# Altium schematic symbol library GyokuRe.SchLib: 1131 symbols (part 5 of 8) (continued)
## MAX1037
designator U?
4 Channel 8 Bit ADC, I2C interface, 2.7V to 3.6V Supply; Vendor: Digikey; Published: 5-Jan-2004; DatasheetDocument: Rev1, Oct-2002; Publisher: Altium Limited; ComponentLink1Description: Digikey Part Link; ComponentLink2Description: Open Datasheet; ComponentLink2URL: H:\LIBRARY\LIBRARY.Datasheet\
footprint SOT23_8 (Small Outline; 8 Leads; Body 2.9 x 1.6 mm (LxW max))
pcadlib SOT23_8 (Small Outline; 8 Leads; Body 2.9 x 1.6 mm (LxW max))
pins: 1 AIN0 (in) "Analog Input 0", 2 AIN1 (in) "Analog Input 0", 3 AIN2 (in) "Analog Input 0", 4 AIN3/REF (power) "Analog Input 3/ Reference Input", 5 SCL (io) "I2C Clock Line", 6 SDA (io) "I2C Data Line", 7 GND (power), 8 VDD (power) "Positive Supply"

## MAX1104EUA
designator U?
8 bit CODEC with 4 wire logic interface; Vendor: Digikey; Published: 5-Jan-2004; DatasheetDocument: Rev0, Dec-2000; Publisher: Altium Limited; ComponentLink1Description: Digikey Part Link; ComponentLink2Description: Open Datasheet; ComponentLink2URL: H:\LIBRARY\LIBRARY.Datasheet\
footprint TSSO3x5-G8/X.35 (Shrink Small Outline; 8 Leads; Body Width 3 mm; Pitch 0.65 mm)
pcadlib TSSO3x5-G8/X.35 (Shrink Small Outline; 8 Leads; Body Width 3 mm; Pitch 0.65 mm)
pins: 1 VDD (power) "Positive Supply 2V7 5V5", 2 GND (power), 3 AIN (in) "Analog Input", 4 OUT (out) "Analog Output", 5 ~{CS} (in) "Chip Select", 6 SCLK (in) "Serial Clock", 7 DOUT (out) "Serial Output", 8 DIN (in) "SPI Serial Input"

## MAX3232
designator U?  (value not drawn)
3.0V TO 5.5V, Low-Power, up to 1Mbps, True RS-232 Transceiver Using Four 0.1µF External Capacitor; Manufacturer: Maxim Integrated Products; Manufacturer P/N: MAX3232CSE+; Vendor: Digikey; Vendor P/N: MAX3232CSE+-ND; Published: 13-April-2009; Publisher: Hoang Nguyen; ComponentLink1Description: Digikey Part Link; ComponentLink2Description: Open Datasheet; ComponentLink2URL: H:\LIBRARY\LIBRARY.Datasheet\; Price: 10000 VND
footprint SOIC16 - MAX232 Label (Small Outline; 16 Leads; Body Width 3.5 mm; Pitch 1.27 mm)
pins: 1 C1+, 2 V+ (power), 3 C1-, 4 C2+, 5 C2-, 6 V- (power), 7 ~{T2OUT} (out), 8 R2IN (in), 9 ~{R2OUT} (out), 10 T2IN (in), 11 T1IN (in), 12 ~{R1OUT} (out), 13 R1IN (in), 14 ~{T1OUT} (out), 15 GND (power), 16 VCC (power)

## MAX5841
designator U?
4 Channel DAC, I2C, 2.7V to 5.5V; Vendor: Digikey; Published: 5-Jan-2004; DatasheetDocument: Rev0, Jan-2002; Publisher: Altium Limited; ComponentLink1Description: Digikey Part Link; ComponentLink2Description: Open Datasheet; ComponentLink2URL: H:\LIBRARY\LIBRARY.Datasheet\
footprint USOP10 (Shrink Small Outline; 10 Leads; Body Width 3 mm; Pitch 0.5 mm)
pcadlib USOP10 (Shrink Small Outline; 10 Leads; Body Width 3 mm; Pitch 0.5 mm)
pins: 1 ADD (in) "I2C Address Select", 2 SCL (io) "I2C Clock", 3 VDD (power) "Positive Supply 2.7V to 5.5V", 4 GND (power), 5 SDA (io) "GND", 6 REF "Reference Voltage Input 1V to VDD", 7 OUTA "DAC Output", 8 OUTB (out) "DAC Output", 9 OUTC (out) "DAC Output", 10 OUTD (out) "DAC Output"

## MBI5027
designator IC?
16 bit Constant Current LED; Creat by: VanDungEvn@Gmail.com; Compoment same: SM16126
footprint SOP_24M_127 (SOP, 24-Leads, Body 15.6x8.1mm, Pitch 1.27mm, IPC Low Density)
pins: 1 GND, 2 SDI, 3 CLK, 4 LE, 5 ~{OUT}0, 6 ~{OUT}1, 7 ~{OUT}2, 8 ~{OUT}3, 9 ~{OUT}4, 10 ~{OUT}5, 11 ~{OUT}6, 12 ~{OUT}7, 13 ~{OUT}8, 14 ~{OUT}9, 15 ~{OUT}10, 16 ~{OUT}11, 17 ~{OUT}12, 18 ~{OUT}13, 19 ~{OUT}14, 20 ~{OUT}15, 21 ~{OE}, 22 SDO, 23 R-EXT, 24 VDD

## MC68HC11F1
designator U?
Motorola MCU; Flash: Kb; SRAM: Bytes; Volt: V; CPU Speed (MIPS): 0 MIPS; ComponentLink1Description: Degikey Part link; ComponentLink2Description: Open DataSheet; ComponentLink2URL: H:\LIBRARY\LIBRARY.Datasheet\; Manufacturer: Motorola; Publisher: Hoang Nguyen
pins: 1 VSS (power), 2 MODB/VSTBY, 3 MODA//LIR, 4 E, 5 R//W, 6 EXTAL, 7 XTAL, 8 4XOUT, 9 PCO/DATA0, 10 PC1/DATA1, 11 PC2/DATA2, 12 PC3/DATA3, 13 PC4/DATA4, 14 PC5/DATA5, 15 PC6/DATA6, 16 PC7/DATA7, 17 /RESET, 18 /XIRQ, 19 /IRQ, 20 PG7//CSPROG, 21 PG6//CSGEN, 22 PG5//CSIO1, 23 PG4//CSIO2, 24 PG3, 25 PG2, 26 PG1, 27 PG0, 28 PD0/RXD, 29 PD1/TXD, 30 PD2/MISO, 31 PD3/MOSI, 32 PD4/SCK, 33 PD5//SS, 34 VDD (power), 35 PA7/PA1/OC1, 36 PA6/OC2/OC1, 37 PA5/OC3/OC1, 38 PA4/OC4/OC1, 39 PA3/OC5/IC4/OC1, 40 PA2/IC1, 41 PA1/IC2, 42 PA0/IC3, 43 PB7/ADDR15, 44 PB6/ADDR14, 45 PB5/ADDR13, 46 PB4/ADDR12, 47 PB3/ADDR11, 48 PB2/ADDR10, 49 PB1/ADDR9, 50 PB0/ADDR8, 51 PF7/ADDR7, 52 PF6/ADDR6, 53 PF5/ADDR5, 54 PF4/ADDR4, 55 PF3/ADDR3, 56 PF2/ADDR2, 57 PF1/ADDR1, 58 PF0/ADDR0, 59 PE0/AN0, 60 PE4/AN4, 61 PE1/AN1, 62 PE5/AN5, 63 PE2/AN2, 64 PE6/AN6, 65 PE3/AN3, 66 PE7/AN7, 67 VRL, 68 VRH

## MC68HC11L6
designator U?  (value not drawn)
Motorola MCU; Flash: Kb; SRAM: Bytes; Volt: V; CPU Speed (MIPS): 0 MIPS; ComponentLink1Description: Degikey Part link; ComponentLink2Description: Open DataSheet; ComponentLink2URL: H:\LIBRARY\LIBRARY.Datasheet\; Manufacturer: Motorola; Publisher: Hoang Nguyen
footprint MC68HC11L6
pins: 1 PB7/A15, 2 PB6/A14, 3 PB5/A13, 4 PB4/A12, 5 PB3/A11, 6 PB2/A10, 7 PB1/A9, 8 PB0/A8, 9 PG4, 10 PG5, 11 PG6, 12 PG7, 13 PE0/AN0, 14 PE4/AN4, 15 PE1/AN1, 16 PE5/AN5, 17 PE2/AN2, 18 PE6/AN6, 19 PE3/AN3, 20 PE7/AN7, 21 VRL, 22 VRH, 23 ANVDD (power), 24 VSS (power), 25 MODB, 26 MODA, 27 STRA/AS, 28 E, 29 STRB/R/W, 30 EXTAL, 31 XTAL, 32 VDD (power), 33 PC0/AD0, 34 PC1/AD1, 35 PC2/AD2, 36 PC3/AD3, 37 PC4/AD4, 38 PC5/AD5, 39 PC6/AD6, 40 PC7/AD7, 41 PG3, 42 PG2, 43 PG1, 44 PG0, 45 RESET, 46 XIRQ, 47 IRQ, 48 PD0/RxD, 49 VSS (power), 50 PD1/TxD, 51 PD2/MISO, 52 PD3/MOSI, 53 PD4/SCK, 54 PD5/SS, 55 VDD (power), 56 PA7/OC1, 57 PA6/OC1, 58 PA5/OC1, 59 PA4/OC1, 60 PA3/OC1, 61 PA2/IC1, 62 PA1/IC2, 63 PA0/IC3, 64 VSS (power)

## MC14093
designator IC?
Quad 2-Input NAND Schmitt Trigger; Value: MC14093
footprint DIP14/W0.3 (14PIN, W 300mil, Pin to pin 100mil)
pins on every part: 7 GND (power) hidden to GND, 14 VDD (power) hidden to VDD
part A pins: 1 A (in), 2 B (in), 3 ~{Y} (out)
part B pins: 4 ~{Y} (out), 5 A (in), 6 B (in)
part C pins: 8 A (in), 9 B (in), 10 ~{Y} (out)
part D pins: 11 ~{Y} (out), 12 A (in), 13 B (in)

## MC14538
designator IC?
Dual Precision Retriggerable/Resettable Monostable Multivibrator; Value: MC14538
footprint DIP16/W0.3 (16 PIN, W 300mil, Pin to pin 100mil)
pins on every part: 1 GND (power) hidden to GND, 8 GND (power) hidden to GND, 15 GND (power) hidden to GND, 16 VDD (power) hidden to VDD
part A pins: 2 CX/RX, 3 ~{CLR} (in), 4 A (in), 5 B (in), 6 Q (out), 7 ~{Q} (out)
part B pins: 9 ~{Q} (out), 10 Q (out), 11 B (in), 12 A (in), 13 ~{CLR} (in), 14 CX/RX

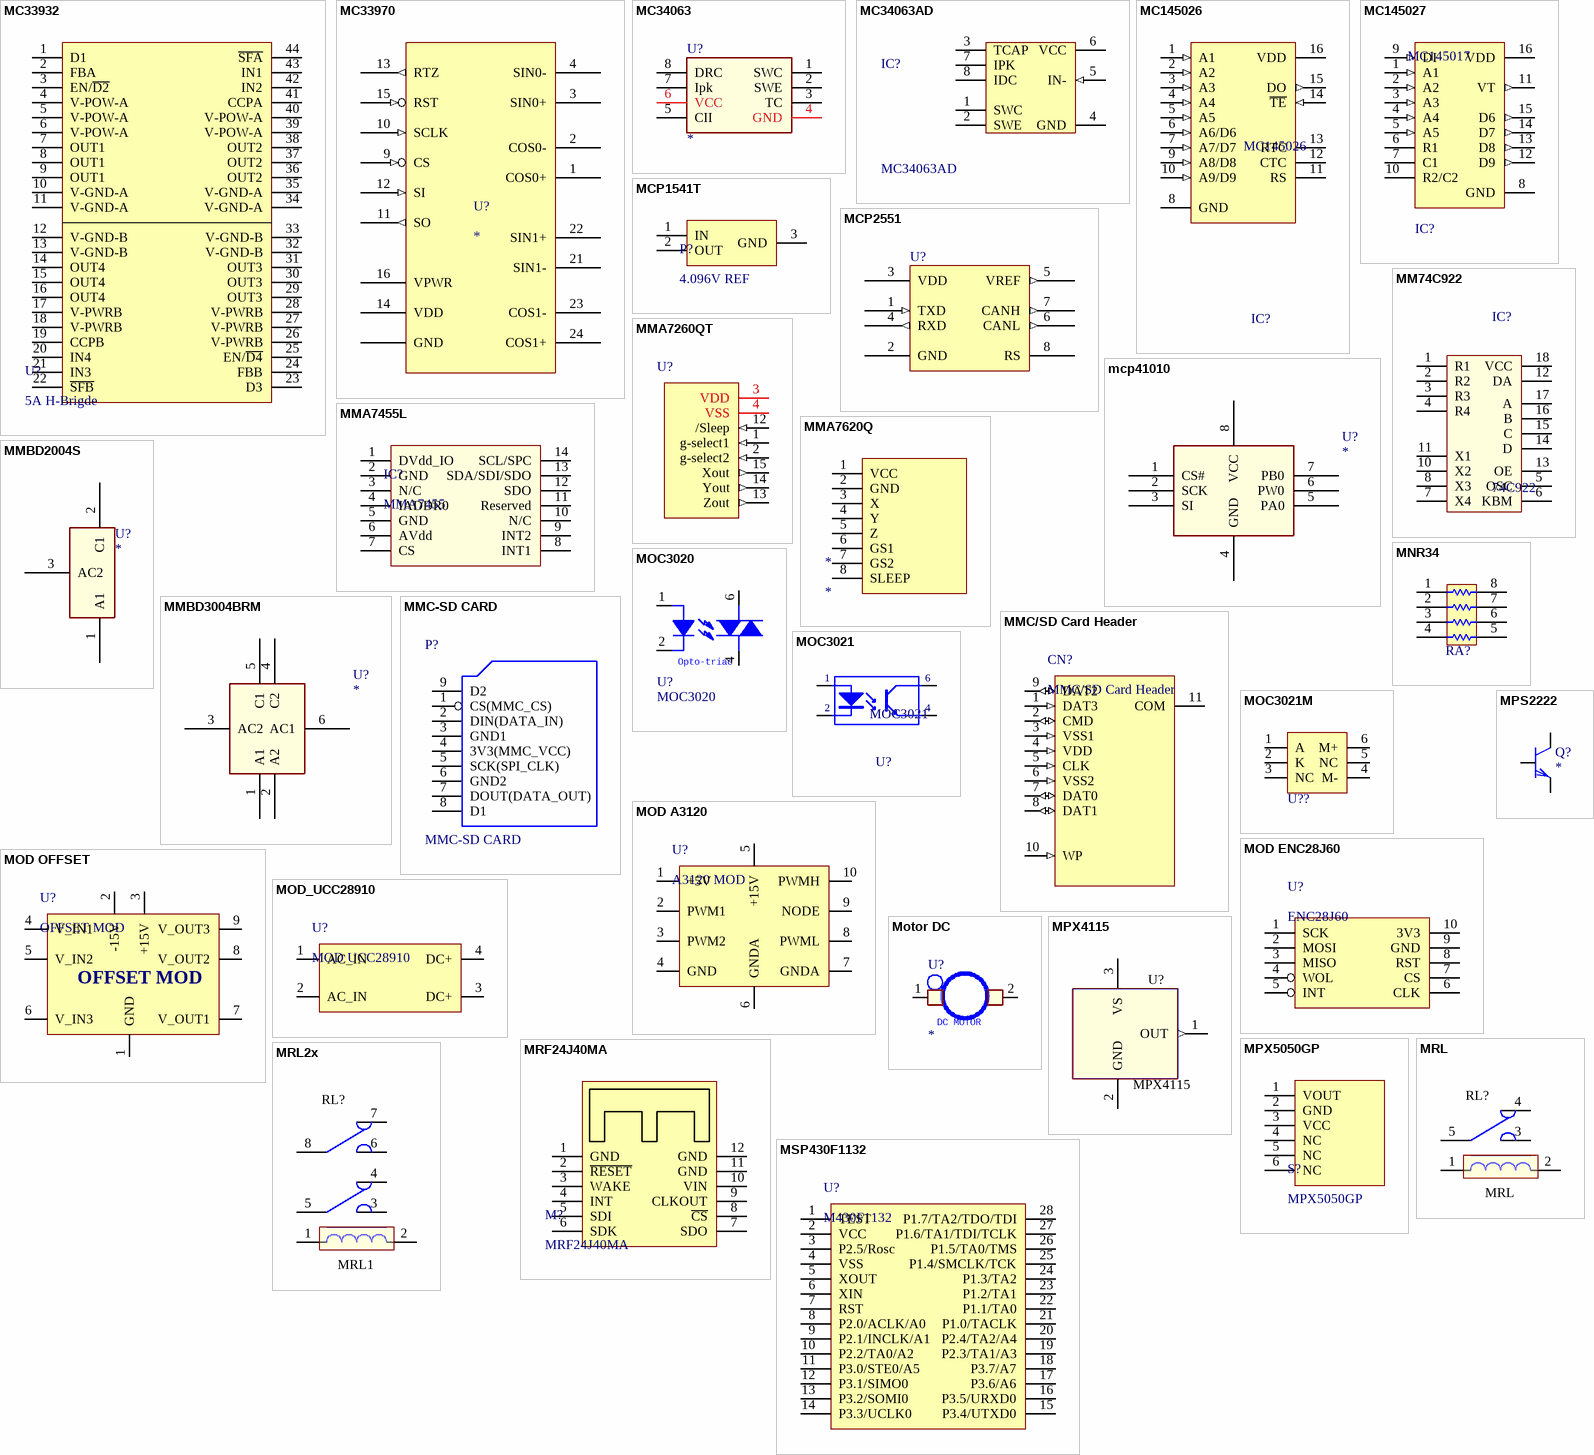
[diagram p30: symbols MC33932 to MSP430F1132]

## MC33932
designator U?, comment 5A H-Brigde
footprint HSOP44-L
pins: 1 D1, 2 FBA, 3 EN/~{D2}, 4 V-POW-A, 5 V-POW-A, 6 V-POW-A, 7 OUT1, 8 OUT1, 9 OUT1, 10 V-GND-A, 11 V-GND-A, 12 V-GND-B, 13 V-GND-B, 14 OUT4, 15 OUT4, 16 OUT4, 17 V-PWRB, 18 V-PWRB, 19 CCPB, 20 IN4, 21 IN3, 22 ~{SFB}, 23 D3, 24 FBB, 25 EN/~{D4}, 26 V-PWRB, 27 V-PWRB, 28 V-PWRB, 29 OUT3, 30 OUT3, 31 OUT3, 32 V-GND-B, 33 V-GND-B, 34 V-GND-A, 35 V-GND-A, 36 OUT2, 37 OUT2, 38 OUT2, 39 V-POW-A, 40 V-POW-A, 41 CCPA, 42 IN2, 43 IN1, 44 ~{SFA}

## MC33970
designator U?
Dual Gauge Driver Integrated Circuit with Improved Damping Algorithms
footprint SOIC-24W (SOIC, 24-Leads, Body 15.4x7.5mm, Pitch 1.27mm, IPC High Density)
pins: 1 COS0+, 2 COS0-, 3 SIN0+, 4 SIN0-, 5 GND, 6 GND hidden to 5, 7 GND hidden to 5, 8 GND hidden to 5, 9 CS (in), 10 SCLK (in), 11 SO (out), 12 SI (in), 13 RTZ (out), 14 VDD, 15 RST (in), 16 VPWR, 17 GND hidden to 5, 18 GND hidden to 5, 19 GND hidden to 5, 20 GND hidden to 5, 21 SIN1-, 22 SIN1+, 23 COS1-, 24 COS1+

## MC34063
designator U?
Vendor: Digikey; Published: 13-April-2009; Publisher: Hoang Nguyen; ComponentLink1Description: Digikey Part Link; ComponentLink2Description: Open Datasheet; ComponentLink2URL: H:\LIBRARY\LIBRARY.Datasheet\
footprint Dip8 (Dual Inline Package 8 pins)
footprint SO-G8 (Small Outline; 8 Leads; Body Width 3.5 mm; Pitch 1.27 mm)
pins: 1 SWC, 2 SWE, 3 TC, 4 GND, 5 CII, 6 VCC, 7 Ipk, 8 DRC

## MC34063AD
designator IC?
DC-to-DC Converter Control Circuit; Published: 15-Apr-2002; LatestRevisionDate: 13-Apr-2006; LatestRevisionNote: IPC-7351 Footprint Added.; DatasheetVersion: 1996; PackageVersion: 1998; PackageReference: 751-05; Publisher: Altium Limited; PackageDescription: 8-Pin Small Outline Integrated Circuit 1.27 mm Pitch; Code_JEDEC: MS-012-AA; Code_IPC: SOIC127P600-8; ComponentLink1Description: Manufacturer Link; ComponentLink1URL: http://www.onsemi.com/site/products/taxonomy/0,4438,503,00.html; ComponentLink2Description: Datasheet; ComponentLink2URL: http://www.onsemi.com/pub/Collateral/MC34063A-D.PDF
footprint SO-G8/Z7.45 (Small Outline; 8 Leads; Body Width 3.9 mm; Pitch 1.27 mm)
footprint DIP8/W0.3 (8 PIN, W 300mil, Pin to pin 100mil)
pins: 1 SWC, 2 SWE, 3 TCAP, 4 GND (power), 5 IN- (in), 6 VCC (power), 7 IPK, 8 IDC (oc)

## MC145026
designator IC?
Encoder Remote; Value: MC145026
footprint DIP16/W0.3 (16 PIN, W 300mil, Pin to pin 100mil)
pins: 1 A1 (in), 2 A2 (in), 3 A3 (in), 4 A4 (in), 5 A5 (in), 6 A6/D6 (in), 7 A7/D7 (in), 8 GND (power), 9 A8/D8 (in), 10 A9/D9 (in), 11 RS, 12 CTC, 13 RTC, 14 ~{TE} (in), 15 DO (out), 16 VDD (power)

## MC145027
designator IC?, comment MC145017
Decoder Remote; Value: MC145027
footprint DIP16/W0.3 (16 PIN, W 300mil, Pin to pin 100mil)
pins: 1 A1 (in), 2 A2 (in), 3 A3 (in), 4 A4 (in), 5 A5 (in), 6 R1, 7 C1, 8 GND (power), 9 DI (in), 10 R2/C2, 11 VT (out), 12 D9 (out), 13 D8 (out), 14 D7 (out), 15 D6 (out), 16 VDD (power)

## MCP1541T
designator P?, comment 4.096V REF
footprint SOT233
pins: 1 IN, 2 OUT, 3 GND

## MCP2551
designator U?
High Speed Can Transceiver; Vendor: Digikey; Published: 5-Jan-2004; DatasheetDocument: 28-Jul-2003; Publisher: Altium Limited; ComponentLink1Description: Digikey Part Link; ComponentLink2Description: Open Datasheet; ComponentLink2URL: H:\LIBRARY\LIBRARY.Datasheet\
footprint SOIC8 (Small Outline; 8 Leads; Body Width 3.9 mm; Pitch 1.27 mm)
pcadlib SOIC8 (Small Outline; 8 Leads; Body Width 3.9 mm; Pitch 1.27 mm)
pins: 1 TXD (in) "Screw Terminal", 2 GND (power), 3 VDD (power) "Positive Supply 4.5V to 5.5V", 4 RXD (out) "Receive Data", 5 VREF (out) "Reference Voltage", 6 CANL (out) "CAN Bus Low Line", 7 CANH (out) "CAN Bus High Line", 8 RS "Mode/Slope Setting"

## mcp41010
designator U?
Vendor: Digikey; Published: 13-April-2009; Publisher: Hoang Nguyen; ComponentLink1Description: Digikey Part Link; ComponentLink2Description: Open Datasheet; ComponentLink2URL: H:\LIBRARY\LIBRARY.Datasheet\
footprint IC8N
pins: 1 CS#, 2 SCK, 3 SI, 4 GND, 5 PA0, 6 PW0, 7 PB0, 8 VCC

## MM74C922
designator IC?, comment 74C922
16 Key Encoder With Debouncer; Value: MM74C922
footprint DIP18/W0.3 (18 PIN, W 300mil, Pin to pin 100mil)
pins: 1 R1, 2 R2, 3 R3, 4 R4, 5 OSC, 6 KBM, 7 X4, 8 X3, 9 GND hidden to GND, 10 X2, 11 X1, 12 DA, 13 OE, 14 D, 15 C, 16 B, 17 A, 18 VCC

## MMA7260QT
designator U?  (value not drawn)
Three Axis Low-g Micromachined Accelerometer; Manufacturer: FreeScale Semiconductor; Accelerometer: ±1.5g, 2g, 4g, 6g; Voltage Rating: 3.3V; Vendor: Digikey; Publisher: Hoang Nguyen; ComponentLink1Description: Digikey Part Link; ComponentLink1URL: http://search.digikey.com/scripts/DkSearch/dksus.dll?Detail&name=MMA7260QT-ND; ComponentLink2Description: Open Datasheet; ComponentLink2URL: H:\LIBRARY\LIBRARY.Datasheet\MMA7260QT.pdf; Family: low-g; Feature: Linear; Published: 13-April-2009
footprint QFN16N.MMA7260QT (QFN, 16-Leads, Body 6.0x6.0mm (max), Pitch 1.00mm, IPC Medium Density)
pins: 1 g-select1 (in) "Logic input pin to select g level", 2 g-select2 (in) "Logic input pin to select g level", 3 VDD (power) "Power Supply Input", 4 VSS (power) "Power Supply Ground", 12 /Sleep (in) "Logic input pin to enable product or Sleep Mode", 13 Zout (out) "Z direction output voltage", 14 Yout (out) "Y direction output voltage", 15 Xout (out) "X direction output voltage"

## MMA7455L
designator IC?, comment MMA7455
±2g/±4g/±8g Three Axis Low-g  Digital Output Accelerometer
footprint MMA7455 (Footprint not found)
pins: 1 DVdd_IO, 2 GND, 3 N/C, 4 IADDR0, 5 GND, 6 AVdd, 7 CS, 8 INT1, 9 INT2, 10 N/C, 11 Reserved, 12 SDO, 13 SDA/SDI/SDO, 14 SCL/SPC

## MMA7620Q
designator *
footprint MMA7260Q (Connector; Header; 8 Position)
pins: 1 VCC, 2 GND, 3 X, 4 Y, 5 Z, 6 GS1, 7 GS2, 8 SLEEP

## MMBD2004S
designator U?
ComponentLink1Description: Digikey Part Link; ComponentLink2Description: Open Datasheet; ComponentLink2URL: H:\LIBRARY\LIBRARY.Datasheet\
footprint SN65220
pins: 1 A1, 2 C1, 3 AC2

## MMBD3004BRM
designator U?
ComponentLink1Description: Digikey Part Link; ComponentLink2Description: Open Datasheet; ComponentLink2URL: H:\LIBRARY\LIBRARY.Datasheet\
footprint SN65220
pins: 1 A1, 2 A2, 3 AC2, 4 C2, 5 C1, 6 AC1

## MMC-SD CARD
designator P?
Header, 6-Pin; LatestRevisionDate: 17-Jul-2002; LatestRevisionNote: Re-released for DXP Platform.; Publisher: Altium Limited
footprint MMC
pins: 1 CS(MMC_CS), 2 DIN(DATA_IN), 3 GND1, 4 3V3(MMC_VCC), 5 SCK(SPI_CLK), 6 GND2, 7 DOUT(DATA_OUT), 8 D1, 9 D2, 10 hidden to GND, 11 hidden to GND, 12 hidden to GND, 13 hidden to GND, 14 hidden to GND, 15 hidden to GND, 16 hidden to GND, 17 hidden to GND
2 alternate drawings of the same symbol

## MMC/SD Card Header
designator CN?
ComponentLink2Description: Open DataSheet; ComponentLink2URL: H:\LIBRARY\LIBRARY.Datasheet\
footprint SDCard/MMC
pins: 1 DAT3 (in), 2 CMD (io), 3 VSS1 (in), 4 VDD (in), 5 CLK (in), 6 VSS2 (in), 7 DAT0 (io), 8 DAT1 (io), 9 DAT2 (io), 10 WP (in), 11 COM

## MNR34
designator RA?
Resistor Array, 8 pin, 4 Element, 100 Ohms; Vendor: Digikey; Published: 5-Jan-2004; DatasheetDocument: 07-Jun-2001; Publisher: Altium Limited; ComponentLink1Description: Digikey Part Link; ComponentLink2Description: Open Datasheet; ComponentLink2URL: H:\LIBRARY\LIBRARY.Datasheet\
footprint MNR34 (Surface Mount, Chip Resistor Array; 5.2mm x 3.1 mm (LxW))
pcadlib MNR34 (Surface Mount, Chip Resistor Array; 5.2mm x 3.1 mm (LxW))
pins: 1, 2, 3, 4, 5, 6, 7, 8

## MOC3020
designator U?
Opto Triac; Vendor: Digikey; Published: 13-April-2009; Publisher: Hoang Nguyen; ComponentLink1Description: Digikey Part Link; ComponentLink2Description: Open Datasheet; ComponentLink2URL: H:\LIBRARY\LIBRARY.Datasheet\
footprint DIP6
footprint DIP6N
pins: 1, 2, 4, 6
text: Opto-triac

## MOC3021
designator U?
Single Opto; Value: MOC3021
footprint DIP6/W0.3 (6 PIN, W 300mil, Pin to pin 100mil)
pins: 1 A "Anode", 2 K "Cathode", 4 E "Emitter", 6 C "Collector"

## MOC3021M
designator U??  (value not drawn)
footprint MOC30XX
pins: 1 A, 2 K, 3 NC, 4 M-, 5 NC, 6 M+

## MOD A3120
designator U?, comment A3120 MOD
footprint Header 10 (Connector; Header; 10 Position; Solder Pad 35mil)
pins: 1 +5V, 2 PWM1, 3 PWM2, 4 GND, 5 +15V, 6 GNDA, 7 GNDA, 8 PWML, 9 NODE, 10 PWMH

## MOD ENC28J60
designator U?, comment ENC28J60
footprint MOD_ENC28J60
pins: 1 SCK, 2 MOSI, 3 MISO, 4 WOL, 5 INT, 6 CLK, 7 CS, 8 RST, 9 GND, 10 3V3

## MOD OFFSET
designator U?, comment OFFSET MOD
footprint Header 9 (Connector; Header; 9 Position; Solder Pad 35mil)
pins: 1 GND, 2 -15V, 3 +15V, 4 V_IN1, 5 V_IN2, 6 V_IN3, 7 V_OUT1, 8 V_OUT2, 9 V_OUT3

## MOD_UCC28910
designator U?, comment MOD UCC28910
footprint MOD_UCC28910
pins: 1 AC_IN, 2 AC_IN, 3 DC+, 4 DC+

## Motor DC
designator U?
DC Motor; Vendor: Digikey; Published: 13-April-2009; Publisher: Hoang Nguyen; ComponentLink1Description: Digikey Part Link; ComponentLink2Description: Open Datasheet; ComponentLink2URL: H:\LIBRARY\LIBRARY.Datasheet\
pins: 1, 2
text: DC MOTOR

## MPS2222
designator Q?
PSpiceTemplate: Q^@REFDES %c %b %e @MODEL; Vendor: Digikey; Published: 13-April-2009; Publisher: Hoang Nguyen; ComponentLink1Description: Digikey Part Link; ComponentLink2Description: Open Datasheet; ComponentLink2URL: H:\LIBRARY\LIBRARY.Datasheet\
footprint TO92
simulation model MPS2222
pins: 1 e, 2 b, 3 c

## MPX4115
designator U?
Pressure sensor - 150 - 1150 mBar; Value: *; ComponentLink2URL: H:\LIBRARY\LIBRARY.Datasheet\
footprint MPX4115
pins: 1 OUT (out), 2 GND (power), 3 VS (power)

## MPX5050GP
designator S?
50kPa Air Pressure Sensor
footprint HDR1X6 (Connector; Header; 6 Position)
pins: 1 VOUT, 2 GND, 3 VCC, 4 NC, 5 NC, 6 NC

## MRF24J40MA
designator M?
Microchip Zigbee Module
footprint MRF24J40MA (Microchip Zigbee Module)
pins: 1 GND, 2 ~{RESET}, 3 WAKE, 4 INT, 5 SDI, 6 SDK, 7 SDO, 8 ~{CS}, 9 CLKOUT, 10 VIN, 11 GND, 12 GND

## MRL
designator RL?  (value not drawn)
Micro-relè Body 15x10 mm - 1 x scambio; Vendor: Digikey; Value: *; Published: 13-April-2009; Publisher: Hoang Nguyen; ComponentLink1Description: Digikey Part Link; ComponentLink2Description: Open Datasheet; ComponentLink2URL: H:\LIBRARY\LIBRARY.Datasheet\
footprint MRL
pins: 1, 2, 3, 4, 5

## MRL2x
designator RL?  (value not drawn)
Micro-relè Body 22x10 mm - 2 ways; Vendor: Digikey; Value: *; Published: 13-April-2009; Publisher: Hoang Nguyen; ComponentLink1Description: Digikey Part Link; ComponentLink2Description: Open Datasheet; ComponentLink2URL: H:\LIBRARY\LIBRARY.Datasheet\
footprint MRL1
pins: 1, 2, 3, 4, 5, 6, 7, 8
text: MRL1

## MSP430F1132
designator U?, comment M430F1132
pins: 1 TEST, 2 VCC, 3 P2.5/Rosc, 4 VSS, 5 XOUT, 6 XIN, 7 RST, 8 P2.0/ACLK/A0, 9 P2.1/INCLK/A1, 10 P2.2/TA0/A2, 11 P3.0/STE0/A5, 12 P3.1/SIMO0, 13 P3.2/SOMI0, 14 P3.3/UCLK0, 15 P3.4/UTXD0, 16 P3.5/URXD0, 17 P3.6/A6, 18 P3.7/A7, 19 P2.3/TA1/A3, 20 P2.4/TA2/A4, 21 P1.0/TACLK, 22 P1.1/TA0, 23 P1.2/TA1, 24 P1.3/TA2, 25 P1.4/SMCLK/TCK, 26 P1.5/TA0/TMS, 27 P1.6/TA1/TDI/TCLK, 28 P1.7/TA2/TDO/TDI

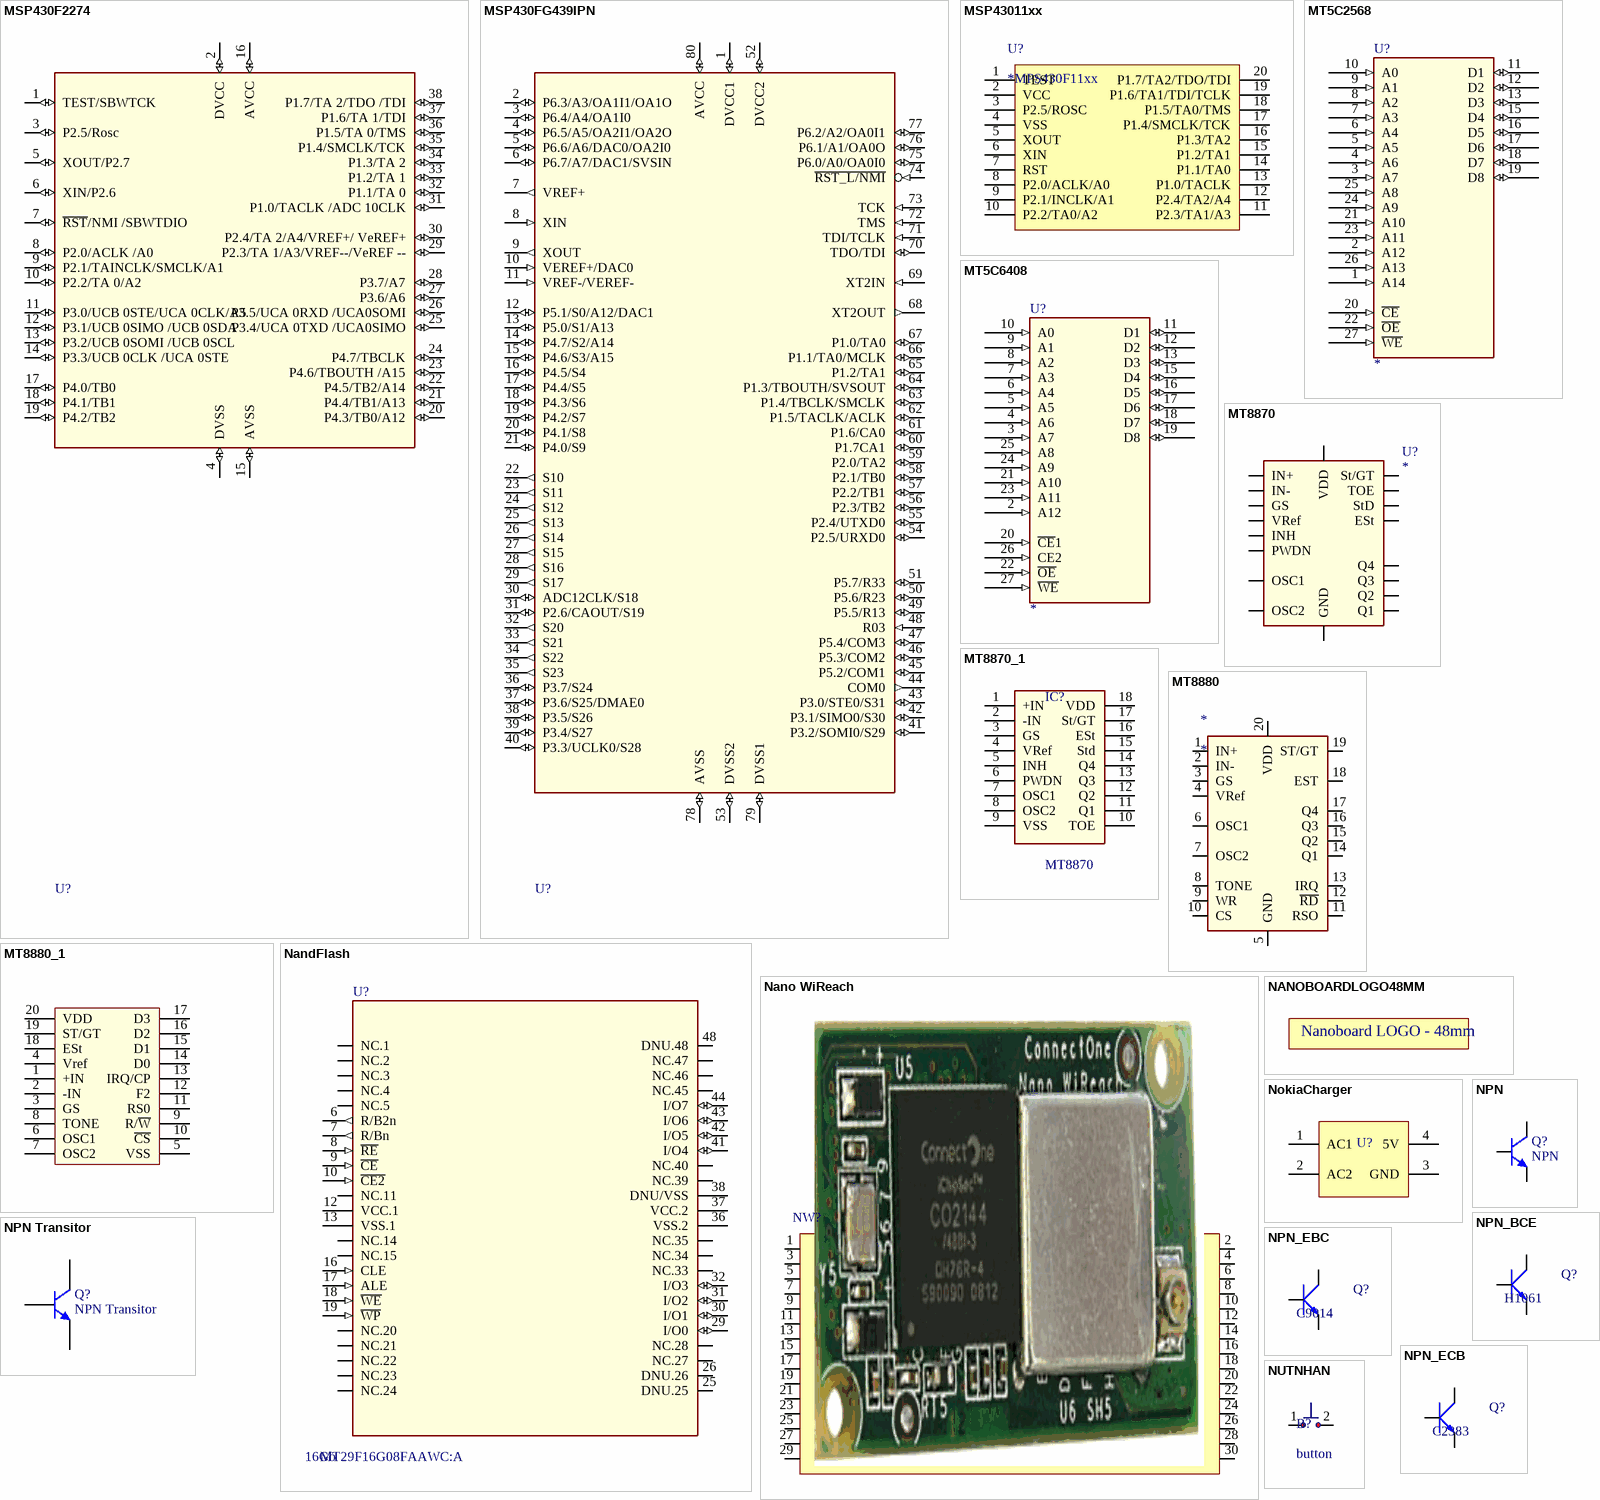
[diagram p31: symbols MSP430F2274 to NUTNHAN]

## MSP430F2274
designator U?
16-bit MCU MSP430 family Texas Instrument; Flash: Kb; SRAM: Bytes; Volt: V; CPU Speed (MIPS): 0 MIPS; ComponentLink1Description: Degikey Part link; ComponentLink1URL: http://search.digikey.com/scripts/DkSearch/dksus.dll?Detail&name=296-17013-ND; ComponentLink2Description: Open DataSheet; ComponentLink2URL: H:\LIBRARY\LIBRARY.Datasheet\msp430fg437.pdf; Publisher: Hoang Nguyen; Manufacturer: Texas Instrument; Price: 13.24 [USD]
footprint SSOP-38 - MSP430F22xx (SSOP, Plastic; 38 Leads; Body Width 5.2 mm; Pitch 0.65 mm)
pins: 1 TEST/SBWTCK (io), 2 DVCC (io), 3 P2.5/Rosc (io), 4 DVSS (io), 5 XOUT/P2.7 (io), 6 XIN/P2.6 (io), 7 ~{RST}/NMI /SBWTDIO (io), 8 P2.0/ACLK /A0 (io), 9 P2.1/TAINCLK/SMCLK/A1 (io), 10 P2.2/TA 0/A2 (io), 11 P3.0/UCB 0STE/UCA 0CLK/A5 (io), 12 P3.1/UCB 0SIMO /UCB 0SDA (io), 13 P3.2/UCB 0SOMI /UCB 0SCL (io), 14 P3.3/UCB 0CLK /UCA 0STE (io), 15 AVSS (io), 16 AVCC (io), 17 P4.0/TB0 (io), 18 P4.1/TB1 (io), 19 P4.2/TB2 (io), 20 P4.3/TB0/A12 (io), 21 P4.4/TB1/A13 (io), 22 P4.5/TB2/A14 (io), 23 P4.6/TBOUTH /A15 (io), 24 P4.7/TBCLK (io), 25 P3.4/UCA 0TXD /UCA0SIMO (io), 26 P3.5/UCA 0RXD /UCA0SOMI (io), 27 P3.6/A6 (io), 28 P3.7/A7 (io), 29 P2.3/TA 1/A3/VREF--/VeREF -- (io), 30 P2.4/TA 2/A4/VREF+/ VeREF+ (io), 31 P1.0/TACLK /ADC 10CLK (io), 32 P1.1/TA 0 (io), 33 P1.2/TA 1 (io), 34 P1.3/TA 2 (io), 35 P1.4/SMCLK/TCK (io), 36 P1.5/TA 0/TMS (io), 37 P1.6/TA 1/TDI (io), 38 P1.7/TA 2/TDO /TDI (io)